# Altium footprint library distance_sensor.PcbLib: 25 footprints (part 1 of 2)
Each footprint in its own frame and in the unit in brackets; x right, y up, seen from the top. Pads: shape width x height; smd on the part's side, far side on the other; paste and mask are expansions set on the pad; w line width, h text height; cw(c..) or ccw(c..) is an arc to the next point about the centre after c.
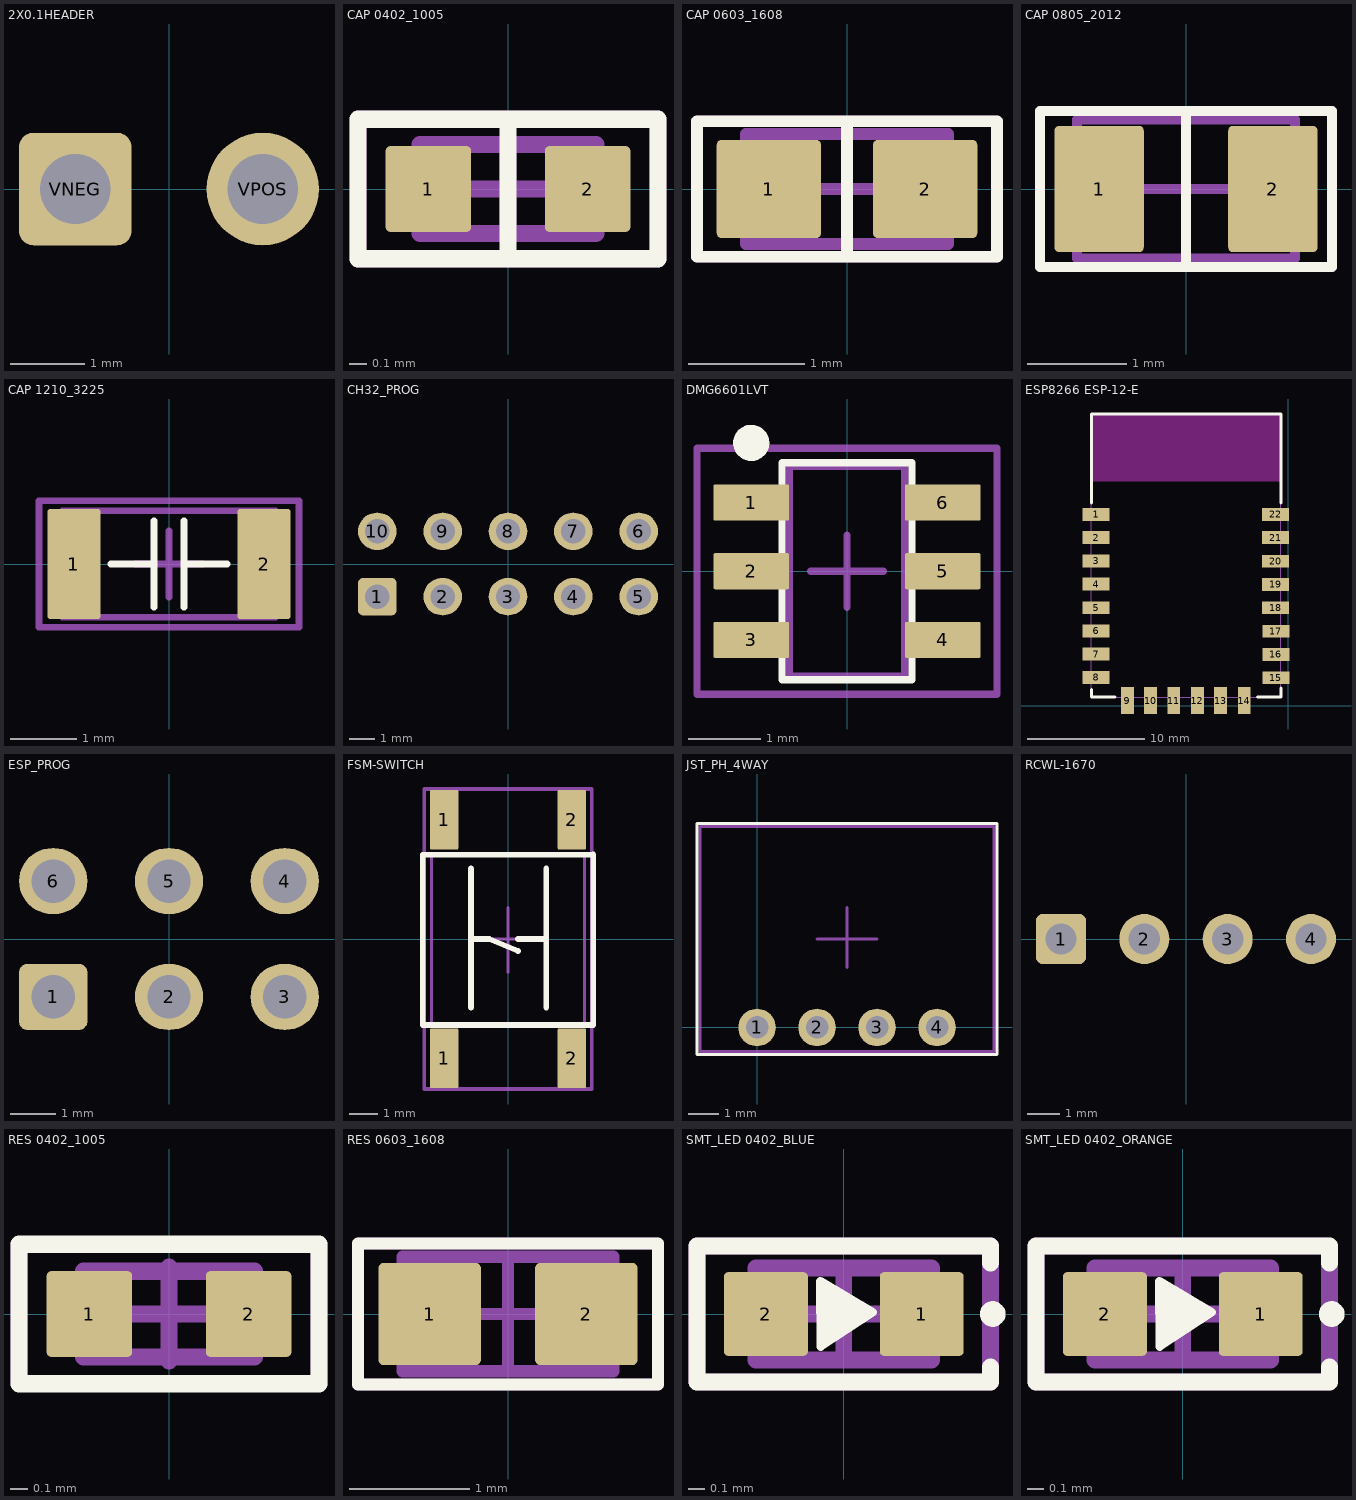
[diagram p0: the footprints below, top view; thin cyan lines are the x and y axes]

## 2X0.1HEADER [mil] "2 x 0.1 inch header"
pads (2):
  rrect25% 60x60 hole 37.4: VNEG(-50,0)
  round 60 hole 37.4: VPOS(50,0)

## CAP 0402_1005 [mm] "Chip Capacitor, 2-Leads, Body 1.02x0.51mm, IPC Medium Density"
height 0.52
pads (2):
  rrect10% 0.5x0.5 smd: 1(-0.465,0) 2(0.465,0)
Top Overlay:
  lines w0.102: 0,-0.406 0,0.406 ; -0.876,-0.406 -0.876,0.406 0.876,0.406 0.876,-0.406 -0.876,-0.406
Top Assembly:
  lines w0.1: -0.515,-0.26 -0.515,0.26 0.515,0.26 0.515,-0.26 -0.515,-0.26
Top Courtyard:
  lines w0.1: -0.26,0 0.26,0 ; 0,-0.26 0,0.26
  lines w0.102: -0.876,-0.406 0.876,-0.406 0.876,0.406 -0.876,0.406 -0.876,-0.406
3D body "0402 cap.STEP": height 0.52, standoff 0, extent -0.5,-0.262 0.5,0.262

## CAP 0603_1608 [mm] "Chip Capacitor, 2-Leads, Body 1.60x0.80mm, IPC Medium Density"
height 0.89
pads (2):
  rrect10% 0.9x0.85 smd: 1(-0.675,0) 2(0.675,0)
Top Overlay:
  lines w0.102: 0,-0.584 0,0.584 ; -1.295,-0.584 -1.295,0.584 1.295,0.584 1.295,-0.584 -1.295,-0.584
Top Assembly:
  lines w0.102: -0.875,-0.475 -0.875,0.475 0.875,0.475 0.875,-0.475 -0.875,-0.475
Top Courtyard:
  lines w0.102: -0.475,0 0.475,0 ; 0,-0.475 0,0.475 ; -1.295,-0.584 -1.295,0.584 1.295,0.584 1.295,-0.584 -1.295,-0.584
3D body "0603 cap.STEP": height 0.82, standoff 0, extent -0.8,-0.412 0.8,0.412

## CAP 0805_2012 [mm] "Chip Capacitor, 2-Leads, Body 2.00x1.20mm, IPC Medium Density"
height 1.15
pads (2):
  rrect10% 0.9x1.275 smd: 1(-0.876,0) 2(0.876,0)
Top Overlay:
  lines w0.102: 0,-0.787 0,0.787 ; -1.473,-0.787 -1.473,0.787 1.473,0.787 1.473,-0.787 -1.473,-0.787
Top Assembly:
  lines w0.1: -1.1,-0.7 -1.1,0.7 1.1,0.7 1.1,-0.7 -1.1,-0.7
Top Courtyard:
  lines w0.1: -0.5,0 0.5,0 ; 0,-0.5 0,0.5
  lines w0.102: -1.473,-0.787 1.473,-0.787 1.473,0.787 -1.473,0.787 -1.473,-0.787
3D body "0805 cap.STEP": height 1.26, standoff -0.02, extent -1,-0.637 1,0.637

## CAP 1210_3225 [mm] "Chip Capacitor, 2-Leads, Body 3.20x1.60mm, IPC High Density"
height 1.2
pads (2):
  rrect10% 0.8x1.65 smd: 1(-1.425,0) 2(1.425,0)
Top Overlay:
  lines w0.102: -0.875,0 -0.225,0 ; -0.225,-0.65 -0.225,0.65 ; 0.225,-0.65 0.225,0.65 ; 0.225,0 0.875,0
Top Assembly:
  lines w0.102: -1.6,-0.8 -1.6,0.8 1.6,0.8 1.6,-0.8 -1.6,-0.8
Top Courtyard:
  lines w0.102: -0.5,0 0.5,0 ; 0,-0.5 0,0.5 ; -1.95,-0.95 -1.95,0.95 1.95,0.95 1.95,-0.95 -1.95,-0.95
3D body "CAPC3216X12L.step": height 1.2, standoff 0, extent -1.6,-0.8 1.6,0.8

## CH32_PROG [mm]
pads (10):
  rrect25% 1.5x1.45 hole 0.95: 1(-5.08,-1.27)
  oval 1.5x1.45 hole 0.95: 2(-2.54,-1.27) 3(0,-1.27) 4(2.54,-1.27) 5(5.08,-1.27) 6(5.08,1.27) 7(2.54,1.27) 8(0,1.27) 9(-2.54,1.27) 10(-5.08,1.27)

## DMG6601LVT [mm]
height 1
pads (6):
  rrect10% 1.05x0.5 smd: 1(-1.325,0.95) 2(-1.325,0) 3(-1.325,-0.95) 4(1.325,-0.95) 5(1.325,0) 6(1.325,0.95)
Top Overlay:
  circle w0.25: c-1.325,1.775 r0.125
  lines w0.102: -0.9,-1.5 0.9,-1.5 0.9,1.5 -0.9,1.5 -0.9,-1.5
Top Assembly:
  lines w0.102: -0.8,-1.45 -0.8,1.45 0.8,1.45 0.8,-1.45 -0.8,-1.45
Top Courtyard:
  lines w0.1: -0.5,0 0.5,0 ; 0,-0.5 0,0.5
  lines w0.102: -2.075,-1.7 -2.075,1.7 2.075,1.7 2.075,-1.7 -2.075,-1.7
3D body "DMG6601LVT.step": height 1, standoff 0, extent -1.4,-1.45 1.4,1.45

## ESP8266 ESP-12-E [mm] "ESP8266 ESP-12-E"
pads (22):
  rrect1% 2.3x1.1 smd: 1(-16.486,16.408) 2(-16.486,14.427) 3(-16.486,12.421) 4(-16.486,10.439) 5(-16.486,8.407) 6(-16.486,6.426) 7(-16.486,4.445) 8(-16.486,2.438) 15(-1.065,2.413) 16(-1.065,4.42) 17(-1.065,6.401) 18(-1.091,8.407) 19(-1.091,10.414) 20(-1.091,12.395) 21(-1.091,14.427) 22(-1.091,16.408)
  rrect1% 1.1x2.3 smd: 9(-13.792,0.456) 10(-11.811,0.456) 11(-9.83,0.456) 12(-7.798,0.456) 13(-5.817,0.456) 14(-3.785,0.456)
Top Overlay:
  lines w0.254: -16.891,1.397 -16.891,0.762 -14.859,0.762 ; -16.891,17.399 -16.891,25.019 -0.635,25.019 -0.635,17.399 ; -2.667,0.762 -0.635,0.762 -0.635,1.524
Keep-Out Layer:
  rectangle: -16.891,19.252 -0.583,25.019
Top Assembly:
  lines w0.102: -16.891,0.762 -16.891,25.019 -0.635,25.019 -0.635,0.762 -16.891,0.762
Top Courtyard:
  lines w0.102: -16.891,0.762 -0.635,0.762 -0.635,25.019 -16.891,25.019 -16.891,0.762
3D body "ESP-12F.STEP": height 3.17, standoff 0, extent -16.788,0.94 -0.788,24.94

## ESP_PROG [mm]
pads (6):
  rrect25% 1.5x1.45 hole 0.95: 1(-2.54,-1.27)
  oval 1.5x1.45 hole 0.95: 2(0,-1.27) 3(2.54,-1.27) 4(2.54,1.27) 5(0,1.27) 6(-2.54,1.27)

## FSM-SWITCH [mm]
pads (4):
  rrect10% 1x2.1 smd: 1(-2.25,-4.2) 1(-2.25,4.2) 2(2.25,-4.2) 2(2.25,4.2)
Top Overlay:
  lines w0.2: 3,-3.028 -3,-3.028 -3,2.972 3,2.972
  lines w0.203: -1.3,-2.416 -1.3,2.487 ; -1.3,0 -0.66,0 0.353,-0.425 ; 0.353,0 1.35,0 ; 1.35,-2.416 1.35,2.487 ; 3,-3.028 3,2.972
Top Assembly:
  lines w0.1: -2.7,-3.028 2.7,-3.028 2.7,2.972 -2.7,2.972 -2.7,-3.028
  lines w0.102: -1.115,0 0,0 ; 0,-1.171 0,0 ; 0,-0.028 0,1.115 ; 1.013,0 0,0
Top Courtyard:
  lines w0.102: -1.115,0 0,0 ; 0,-1.171 0,0 ; 0,-0.028 0,1.115 ; 1.013,0 0,0
  lines w0.127: -2.946,-5.283 2.946,-5.283 2.946,5.283 -2.946,5.283 -2.946,-5.283
3D body "switch.stp.step": height 5.07, standoff -0.01, extent -3,-5 3,5

## JST_PH_4WAY [mm]
pads (4):
  round 1.25 hole 0.75: 1(0,0) 2(2,0) 3(4,0) 4(6,0)
Top Overlay:
  lines w0.102: -2,-0.9 -2,6.8 8,6.8 8,-0.9 -2,-0.9
Top Assembly:
  lines w0.102: -1.9,-0.8 -1.9,6.7 7.9,6.7 7.9,-0.8 -1.9,-0.8
Top Courtyard:
  lines w0.102: 2,2.95 4,2.95 ; 3,2 3,4 ; -1.9,-0.8 -1.9,6.7 7.9,6.7 7.9,-0.8 -1.9,-0.8
3D body "User Library-PCB HEADER (JST SxB-PH-K-S (RIGHT ANGLE)).step": height 0.4, standoff -6.4, extent -1.95,-0.85 7.95,6.75

## RCWL-1670 [mil] "4 pin header for distance sensor"
pads (4):
  rrect25% 60x60 hole 37.4: 1(-150,0)
  round 60 hole 37.4: 2(-50,0) 3(50,0) 4(150,0)

## RES 0402_1005 [mm] "Chip Resistor, 2-Leads, Body 1.0x0.5mm, IPC Medium Density"
height 0.4
pads (2):
  rrect10% 0.5x0.5 smd: 1(-0.465,0) 2(0.465,0)
Top Overlay:
  lines w0.102: -0.876,-0.406 0.876,-0.406 0.876,0.406 -0.876,0.406 -0.876,-0.406
Top Assembly:
  lines w0.1: -0.5,-0.25 0.5,-0.25 0.5,0.25 -0.5,0.25 -0.5,-0.25
Top Courtyard:
  lines w0.1: -0.275,0 0.275,0 ; 0,-0.275 0,0.275 ; -0.876,-0.406 0.876,-0.406 0.876,0.406 -0.876,0.406 -0.876,-0.406
3D body "0402 resistor.STEP": height 0.35, standoff 0, extent -0.5,-0.25 0.5,0.25

## RES 0603_1608 [mm] "Chip Resistor, 2-Leads, Body 1.60x0.80mm, IPC Medium Density"
height 0.45
pads (2):
  rrect10% 0.85x0.85 smd: 1(-0.65,0) 2(0.65,0)
Top Overlay:
  lines w0.102: -1.245,-0.584 1.245,-0.584 1.245,0.584 -1.245,0.584 -1.245,-0.584
Top Assembly:
  lines w0.1: -0.875,-0.475 -0.875,0.475 0.875,0.475 0.875,-0.475 -0.875,-0.475
Top Courtyard:
  lines w0.102: -0.475,0 0.475,0 ; 0,-0.475 0,0.475 ; -1.245,-0.584 -1.245,0.584 1.245,0.584 1.245,-0.584 -1.245,-0.584
3D body "0603 resistor.STEP": height 0.45, standoff 0, extent -0.8,-0.4 0.8,0.4

## SMT_LED 0402_BLUE [mm] "Chip Diode, 2-Leads, Body 1.00x0.50mm, IPC Medium Density"
height 0.25
pads (2):
  rrect10% 0.5x0.5 smd: 1(0.465,0) 2(-0.465,0)
Top Overlay:
  circle w0.102: c0.889,0 r0.025
  region: -0.139,0.195 -0.139,-0.194 0.173,0.01
  lines w0.051: -0.139,0.195 0.173,0.01 -0.139,-0.194 -0.139,0.195
  lines w0.102: 0.876,-0.318 0.876,-0.406 -0.876,-0.406 -0.876,0.406 0.876,0.406 0.876,0.305
Top Assembly:
  lines w0.1: -0.525,-0.275 -0.525,0.275 0.525,0.275 0.525,-0.275 -0.525,-0.275
Top Courtyard:
  lines w0.1: -0.275,0 0.275,0 ; 0,-0.275 0,0.275 ; -0.876,-0.406 0.876,-0.406 0.876,0.406 -0.876,0.406 -0.876,-0.406
3D body "LED 0402 Base BLUE.STEP": height 0.1, standoff 0, extent -0.5,-0.25 0.5,0.25
3D body "LED 0402 Lens BLUE.STEP": height 0.21, standoff 0.08, extent -0.35,-0.25 0.35,0.25

## SMT_LED 0402_ORANGE [mm] "Chip Diode, 2-Leads, Body 1.00x0.50mm, IPC Medium Density"
height 0.25
pads (2):
  rrect10% 0.5x0.5 smd: 1(0.465,0) 2(-0.465,0)
Top Overlay:
  circle w0.102: c0.889,0 r0.025
  region: -0.139,0.195 -0.139,-0.194 0.173,0.01
  lines w0.051: -0.139,0.195 -0.139,-0.194 0.173,0.01 -0.139,0.195
  lines w0.102: 0.876,-0.318 0.876,-0.406 -0.876,-0.406 -0.876,0.406 0.876,0.406 0.876,0.305
Top Assembly:
  lines w0.1: -0.525,-0.275 0.525,-0.275 0.525,0.275 -0.525,0.275 -0.525,-0.275
Top Courtyard:
  lines w0.1: -0.275,0 0.275,0 ; 0,-0.275 0,0.275 ; -0.876,-0.406 -0.876,0.406 0.876,0.406 0.876,-0.406 -0.876,-0.406
3D body "LED 0402 Lens BLUE.STEP": height 0.21, standoff 0.08, extent -0.35,-0.25 0.35,0.25
3D body "LED 0402 Base BLUE.STEP": height 0.1, standoff 0, extent -0.5,-0.25 0.5,0.25